# Altium footprint library ParsaLibrary.PcbLib: 526 footprints (part 12 of 33)
Each footprint in its own frame and in the unit in brackets; x right, y up, seen from the top. Pads: shape width x height; smd on the part's side, far side on the other; paste and mask are expansions set on the pad; w line width, h text height; cw(c..) or ccw(c..) is an arc to the next point about the centre after c.
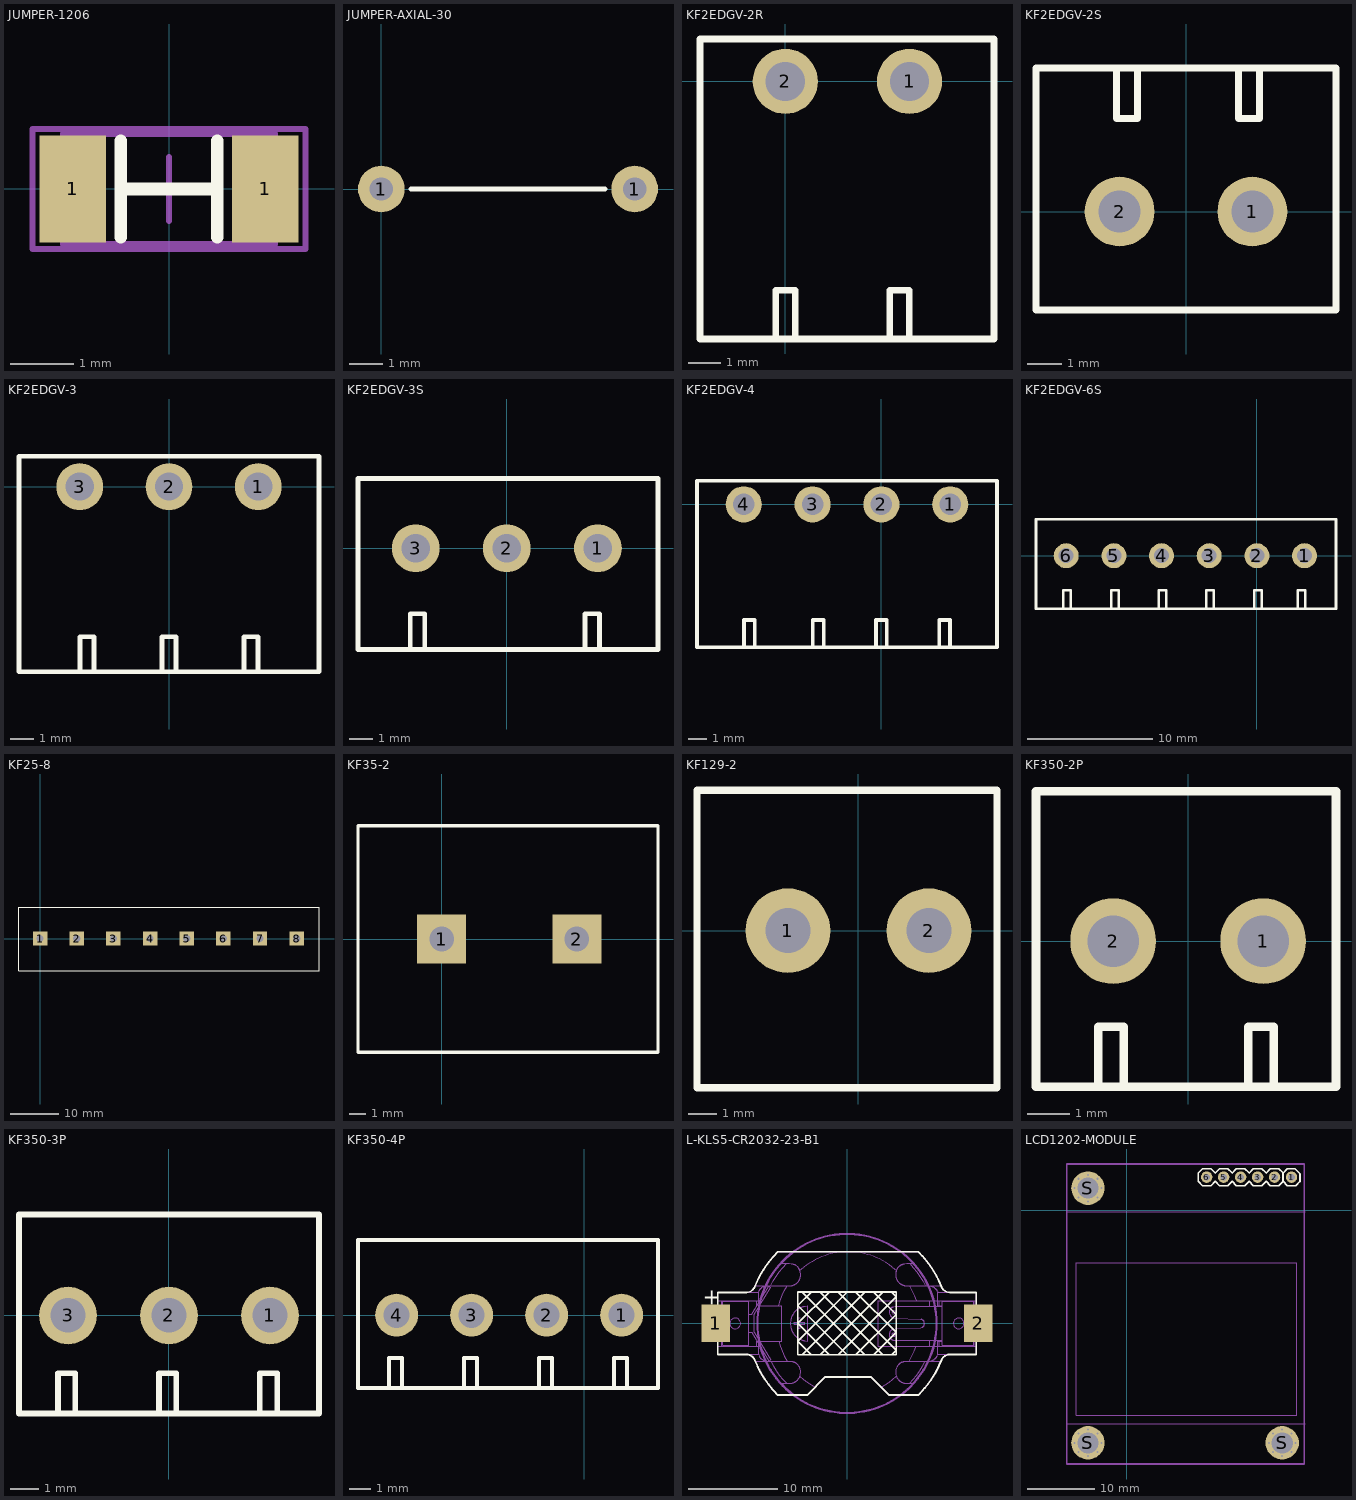
[diagram p11: the footprints below, top view; thin cyan lines are the x and y axes]

## JUMPER-1206 [mm]
pads (2):
  rect 1.05x1.7 smd: 1(-1.524,0) 1(1.524,0)
Top Overlay:
  lines w0.2: -0.762,-0.762 -0.762,0.762 ; -0.762,0 0.762,0 ; 0.762,-0.762 0.762,0.762
Mechanical 13:
  lines w0.1: -1.675,-0.875 -1.675,0.875 1.675,0.875 1.675,-0.875 -1.675,-0.875
Mechanical 15:
  lines w0.1: -0.5,0 0.5,0 ; 0,-0.5 0,0.5 ; -2.159,-0.95 -2.159,0.95 2.159,0.95 2.159,-0.95 -2.159,-0.95
3D body "1206.STEP": height 0.6, standoff 0, extent -1.524,-0.762 1.524,0.762

## JUMPER-AXIAL-30 [mm]
pads (2):
  round 1.4 hole 0.7: 1(0,0) 1(7.62,0)
Top Overlay:
  lines w0.15: 0.889,0 6.731,0
3D body "Resistor Zero.STEP": height 2.5, standoff -2.3, extent -0.4,-1.2 8.02,1.2

## KF2EDGV-2R [mm]
pads (2):
  round 2 hole 1.2: 1(3.81,0) 2(0,0)
Top Overlay:
  lines w0.2: -0.3,-7.8 -0.3,-6.4 0.3,-6.4 0.3,-7.8 ; 3.2,-7.8 3.2,-6.4 3.8,-6.4 3.8,-7.8 ; -2.616,-7.9 6.4,-7.9 6.4,1.3 -2.616,1.3 -2.616,-7.9
3D body "User Library-KEFA 3_81mm_2pin_RA (1).x_b": height 7.88, standoff -3.4, extent -2.61,-17.1 6.4,1.3

## KF2EDGV-2S [mm]
pads (2):
  round 2 hole 1.2: 1(1.905,0) 2(-1.905,0)
Top Overlay:
  lines w0.2: -1.997,4.066 -1.997,2.666 -1.397,2.666 -1.397,4.066 ; 1.503,4.066 1.503,2.666 2.103,2.666 2.103,4.066 ; -4.3,-2.824 -4.3,4.115 4.3,4.115 4.3,-2.824 -4.3,-2.824
3D body "User Library-Terminal Block Header - 2 Pin - ED2819-ND.step": height 9.2, standoff -3.5, extent -4.33,-2.84 4.38,4.16

## KF2EDGV-3 [mm]
pads (3):
  round 2 hole 1.2: 1(3.81,0) 2(0,0) 3(-3.81,0)
Top Overlay:
  lines w0.2: -3.8,-7.8 -3.8,-6.4 -3.2,-6.4 -3.2,-7.8 ; -0.3,-7.8 -0.3,-6.4 0.3,-6.4 0.3,-7.8 ; 3.2,-7.8 3.2,-6.4 3.8,-6.4 3.8,-7.8 ; -6.4,-7.9 -6.4,1.3 6.4,1.3 6.4,-7.9 -6.4,-7.9
3D body "User Library-KEFA 3_81mm_3pin_RA.step": height 7.88, standoff -3.4, extent -6.4,-17.1 6.42,1.3

## KF2EDGV-3S [mm]
pads (3):
  round 2 hole 1.2: 1(3.81,0) 2(0,0) 3(-3.81,0)
Top Overlay:
  lines w0.2: -4.034,-4.142 -4.034,-2.742 -3.434,-2.742 -3.434,-4.142 ; 3.276,-4.142 3.276,-2.742 3.876,-2.742 3.876,-4.142 ; -6.223,-4.242 6.325,-4.242 6.325,2.921 -6.223,2.921 -6.223,-4.242
3D body "User Library-Terminal Block Header - 3 Pin - ED2820-ND.step": height 9.2, standoff -3.5, extent -6.26,-4.181 6.26,2.819

## KF2EDGV-4 [mm]
pads (4):
  round 2 hole 1.2: 1(3.81,0) 2(0,0) 3(-3.81,0) 4(-7.62,0)
Top Overlay:
  lines w0.2: -7.61,-7.8 -7.61,-6.4 -7.01,-6.4 -7.01,-7.8 ; -3.8,-7.8 -3.8,-6.4 -3.2,-6.4 -3.2,-7.8 ; -0.3,-7.8 -0.3,-6.4 0.3,-6.4 0.3,-7.8 ; 3.2,-7.8 3.2,-6.4 3.8,-6.4 3.8,-7.8 ; -10.21,-7.9 6.4,-7.9 6.4,1.3 -10.21,1.3 -10.21,-7.9
3D body "User Library-KEFA 3_81mm_3pin_RA.step": height 7.88, standoff -3.4, extent -6.4,-17.1 6.42,1.3
3D body "User Library-KEFA 3_81mm_3pin_RA.step": height 7.88, standoff -3.4, extent -10.21,-17.1 2.61,1.3

## KF2EDGV-6S [mm]
pads (6):
  round 2 hole 1.2: 1(3.81,0) 2(0,0) 3(-3.81,0) 4(-7.62,0) 5(-11.43,0) 6(-15.24,0)
Top Overlay:
  lines w0.2: -15.464,-4.142 -15.464,-2.742 -14.864,-2.742 -14.864,-4.142 ; -11.654,-4.142 -11.654,-2.742 -11.054,-2.742 -11.054,-4.142 ; -7.844,-4.142 -7.844,-2.742 -7.244,-2.742 -7.244,-4.142 ; -4.034,-4.142 -4.034,-2.742 -3.434,-2.742 -3.434,-4.142 ; -0.224,-4.142 -0.224,-2.742 0.376,-2.742 0.376,-4.142 ; 3.276,-4.142 3.276,-2.742 3.876,-2.742 3.876,-4.142 ; -17.653,-4.242 6.325,-4.242 6.325,2.921 -17.653,2.921 -17.653,-4.242
3D body "User Library-Terminal Block Header - 3 Pin - ED2820-ND.step": height 9.2, standoff -3.5, extent -17.69,-4.181 -5.17,2.819
3D body "User Library-Terminal Block Header - 3 Pin - ED2820-ND.step": height 9.2, standoff -3.5, extent -6.26,-4.181 6.26,2.819

## KF25-8 [mm]
pads (8):
  rect 3x3 hole 1.5: 1(0,0) 2(7.65,0) 3(15.3,0) 4(22.95,0) 5(30.6,0) 6(38.25,0) 7(45.9,0) 8(53.55,0)
Top Overlay:
  lines w0.2: -4.4,-6.7 58.2,-6.7 58.2,6.5 -4.4,6.5 -4.4,-6.7
3D body "User Library-8stg_Barrier_Terminal.STEP": height 15, standoff -6.27, extent -4.4,-6.6 58.1,6.4

## KF35-2 [mm]
pads (2):
  rect 3x3 hole 1.5: 1(0,0) 2(8.25,0)
Top Overlay:
  lines w0.2: -5.1,-6.9 -5.1,6.9 13.2,6.9 13.2,-6.9 -5.1,-6.9
3D body "KF35.STEP": height 14.87, standoff -3.93, extent -5.056,-6.9 13.256,6.9

## KF129-2 [mm]
height 18
pads (2):
  round 3 hole 1.6: 1(-2.5,0) 2(2.5,0)
Top Overlay:
  lines w0.254: -5.725,-5.571 -5.725,4.977 4.913,4.977 4.913,-5.571 -5.725,-5.571
3D body "KF129.SLDPRT": height 18, standoff -4.2, extent -5.685,-5.566 4.915,4.934

## KF350-2P [mm]
pads (2):
  round 2 hole 1.2: 1(1.75,0) 2(-1.75,0)
Top Overlay:
  lines w0.2: -2.1,-3.4 -2.1,-2 -1.5,-2 -1.5,-3.4 ; 1.4,-3.4 1.4,-2 2,-2 2,-3.4 ; -3.55,3.5 3.45,3.5 3.45,-3.4 -3.55,-3.4 -3.55,3.5 ; -3.55,3.5 -3.55,3.5
3D body "User Library-KF350-2P.STEP": height 8.8, standoff -2.6, extent -3.55,-3.4 3.45,3.5

## KF350-3P [mm]
pads (3):
  round 2 hole 1.2: 1(3.5,0) 2(0,0) 3(-3.5,0)
Top Overlay:
  lines w0.2: -3.85,-3.4 -3.85,-2 -3.25,-2 -3.25,-3.4 ; -0.35,-3.4 -0.35,-2 0.25,-2 0.25,-3.4 ; 3.15,-3.4 3.15,-2 3.75,-2 3.75,-3.4 ; -5.2,-3.4 -5.2,3.5 5.2,3.5 5.2,-3.4 -5.2,-3.4
3D body "User Library-KF350-3P.STEP": height 8.8, standoff -2.6, extent -5.25,-3.4 5.25,3.5

## KF350-4P [mm]
pads (4):
  round 2 hole 1.2: 1(1.75,0) 2(-1.75,0) 3(-5.25,0) 4(-8.75,0)
Top Overlay:
  lines w0.2: -9.1,-3.4 -9.1,-2 -8.5,-2 -8.5,-3.4 ; -5.6,-3.4 -5.6,-2 -5,-2 -5,-3.4 ; -2.1,-3.4 -2.1,-2 -1.5,-2 -1.5,-3.4 ; 1.4,-3.4 1.4,-2 2,-2 2,-3.4 ; -3.55,3.5 -10.55,3.5 -10.55,-3.4 -3.55,-3.4 3.45,-3.4 3.45,3.5 -3.55,3.5 ; -3.55,3.5 -3.55,3.5
3D body "User Library-KF350-2P.STEP": height 8.8, standoff -2.6, extent -10.55,-3.4 -3.55,3.5
3D body "User Library-KF350-2P.STEP": height 8.8, standoff -2.6, extent -10.55,-3.4 -3.55,3.5
3D body "User Library-KF350-2P.STEP": height 8.8, standoff -2.6, extent -3.55,-3.4 3.45,3.5

## L-KLS5-CR2032-23-B1 [mm]
pads (2):
  rect 3.2x4.2 smd: 1(-14.65,0) 2(14.65,0)
Top Overlay:
  drawing of 220 lines, arcs and shapes, not listed
  text "+" at -16.1,2.1 h1.78
Mechanical 7:
  drawing of 1332 lines, arcs and shapes, not listed
Mechanical 15:
  circle w0.25: c0,0 r10
3D body "BS-2032-6-2 SMT 3D???.step": height 5.17, standoff -0.01, extent -15.7,-8 15.85,8

## LCD1202-MODULE [mm]
pads (33):
  round 1.7 hole 1: 1(24.638,4.953) 2(22.098,4.953) 3(19.558,4.953) 4(17.018,4.953) 5(14.478,4.953) 6(11.938,4.953)
  round 0.6 hole 0.3: S(-7.842,-34.798) S(-7.842,3.302) S(-7.256,-36.212) S(-7.256,-33.384) S(-7.256,1.888) S(-7.256,4.716) S(-5.842,-36.798) S(-5.842,-32.798) S(-5.842,1.302) S(-5.842,5.302) S(-4.428,-36.212) S(-4.428,-33.384) S(-4.428,1.888) S(-4.428,4.716) S(-3.842,-34.798) S(-3.842,3.302) S(21.241,-34.798) S(21.827,-36.212) S(21.827,-33.384) S(23.241,-36.798) S(23.241,-32.798) S(24.655,-36.212) S(24.655,-33.384) S(25.241,-34.798)
  round 5 hole 3.15 mask+0.1: S(-5.842,-34.798) S(-5.842,3.302) S(23.241,-34.798)
Top Overlay:
  lines w0.254: 19.558,6.223 20.193,6.223 20.828,5.588 21.463,6.223 22.098,6.223 22.733,6.223 23.368,5.588 ; 20.066,6.223 18.923,6.223 18.288,5.588 17.653,6.223 17.018,6.223 ; 16.383,6.223 15.748,5.588 15.113,6.223 14.478,6.223 13.843,6.223 13.208,5.588 12.573,6.223 11.938,6.223 11.303,6.223 10.668,5.588 10.668,4.318 11.303,3.683 12.573,3.683 13.208,4.318 13.843,3.683 15.113,3.683 15.748,4.318 16.383,3.683 17.653,3.683 18.288,4.318 18.923,3.683 20.193,3.683 20.828,4.318 21.463,3.683 22.733,3.683 23.368,4.318 ; 16.383,6.223 17.018,6.223 ; 16.383,6.223 17.018,6.223 ; 23.368,4.318 23.368,5.588 ; 23.368,4.318 24.003,3.683 25.273,3.683 25.908,4.318 25.908,5.461 25.146,6.223 24.003,6.223 23.368,5.588
Mechanical 1:
  lines w0.127: -8.865,-31.979 26.695,-31.979 ; -8.865,-0.229 26.695,-0.229 ; -7.595,-30.709 25.425,-30.709 25.425,-7.849 -7.595,-7.849 -7.595,-30.709
  lines w0.254: -9.017,-37.973 -9.017,6.923 26.518,6.923 26.518,-37.973 -9.017,-37.973
3D body: height 10, standoff 0, extent -8.042,1.102 -3.642,5.502
3D body: height 10, standoff 0, extent -8.042,-36.998 -3.642,-32.598
3D body: height 10, standoff 0, extent 21.041,-36.998 25.441,-32.598
3D body "LCD1202.step": height 9, standoff -3.47, extent -8.966,-38.039 26.746,6.858